# Altium footprint library nccpcblib.PcbLib: 63 footprints (part 1 of 4)
Each footprint in its own frame and in the unit in brackets; x right, y up, seen from the top. Pads: shape width x height; smd on the part's side, far side on the other; paste and mask are expansions set on the pad; w line width, h text height; cw(c..) or ccw(c..) is an arc to the next point about the centre after c.
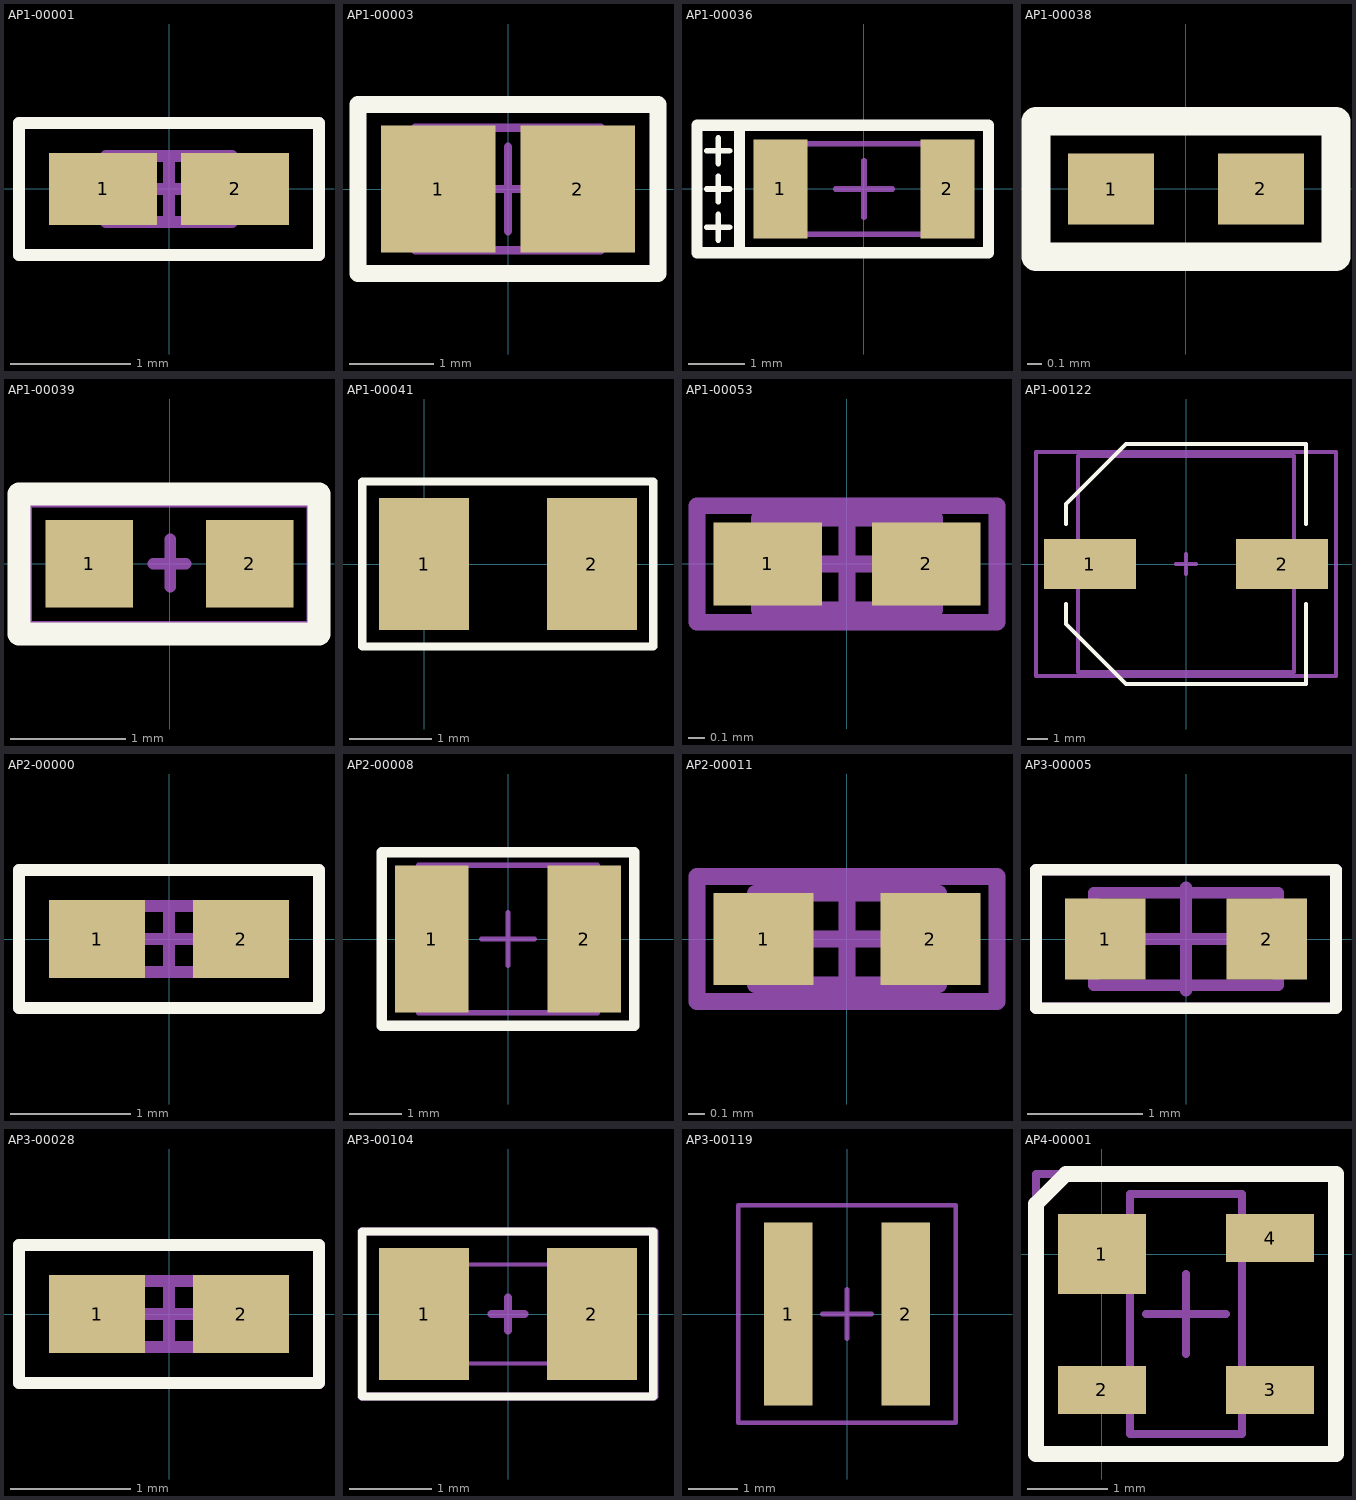
[diagram p0: the footprints below, top view; thin cyan lines are the x and y axes]

## AP1-00001 [mm] "Standard 0402 SMD capacitor footprint"
height 0.55
pads (2):
  rect 0.9x0.6 smd: 1(-0.55,0) 2(0.55,0)
Top Overlay:
  lines w0.1: -1.25,-0.55 1.25,-0.55 1.25,0.55 -1.25,0.55 -1.25,-0.55
Mechanical 13:
  lines w0.1: -0.525,-0.275 0.525,-0.275 0.525,0.275 -0.525,0.275 -0.525,-0.275
Mechanical 15:
  lines w0.1: -0.275,0 0.275,0 ; 0,-0.275 0,0.275 ; -1.25,-0.55 1.25,-0.55 1.25,0.55 -1.25,0.55 -1.25,-0.55
3D body: height 0.2, standoff 0, extent -0.5,-0.3 0.5,0.3

## AP1-00003 [mm]
height 1.3
pads (2):
  rect 1.35x1.5 smd: 1(-0.825,0) 2(0.825,0)
Top Overlay:
  lines w0.2: -1.775,-1 -1.775,1 1.775,1 1.775,-1 -1.775,-1
Mechanical 13:
  lines w0.1: -1.1,-0.725 1.1,-0.725 1.1,0.725 -1.1,0.725 -1.1,-0.725
Mechanical 15:
  lines w0.1: -0.5,0 0.5,0 ; 0,-0.5 0,0.5 ; -1.775,-1 1.775,-1 1.775,1 -1.775,1 -1.775,-1
3D body: height 0.78, standoff 0, extent -1,-0.625 1,0.625

## AP1-00036 [mm] "SMD capacitors: 3216-18 EIA Case 1206, polarized"
height 1.5
pads (2):
  rect 0.95x1.75 smd: 1(-1.475,0) 2(1.475,0)
Top Overlay:
  lines w0.1: -2.775,-0.675 -2.375,-0.675 ; -2.775,0 -2.375,0 ; -2.775,0.675 -2.375,0.675 ; -2.575,-0.9 -2.575,-0.45 ; -2.575,-0.225 -2.575,0.225 ; -2.575,0.45 -2.575,0.9
  lines w0.2: -2.2,-1.125 -2.2,1.125 ; -2.2,-1.125 -2.95,-1.125 -2.95,1.125 -2.2,1.125 ; -2.2,-1.125 2.2,-1.125 2.2,1.125 -2.2,1.125
Mechanical 13:
  lines w0.1: -1.6,-0.8 -1.6,0.8 1.6,0.8 1.6,-0.8 -1.6,-0.8
Mechanical 15:
  lines w0.1: -0.5,0 0.5,0 ; 0,-0.5 0,0.5 ; -2.2,-1.125 -2.2,1.125 2.2,1.125 2.2,-1.125 -2.2,-1.125
3D body: height 1, standoff 0, extent -1.6,-0.8 1.6,0.8

## AP1-00038 [mm] "Generic pad 0402, spacing 0.45mm"
height 0.4
pads (2):
  rect 0.6x0.5 smd: 1(-0.525,0) 2(0.525,0)
Top Overlay:
  lines w0.2: -1.05,-0.475 -1.05,0.475 1.05,0.475 1.05,-0.475 -1.05,-0.475
3D body: height 0.2, standoff 0, extent -0.5,-0.3 0.5,0.3

## AP1-00039 [mil] "Capacitor 0603 Hight 0.8mm"
height 31.5
pads (2):
  rect 30x30 smd: 1(-27.5,0) 2(27.5,0)
Top Overlay:
  lines w7.87: -51.59,-23.98 -51.59,23.9 51.16,23.9 51.16,-23.98 -51.59,-23.98
Mechanical 15:
  lines w3.94: -5.57,0.04 0.14,0.04 ; 0.14,-7.84 0.14,0.04 ; 0.14,8.46 0.14,0.04 ; 5.58,0.04 0.14,0.04 ; -49.04,-21.46 -49.04,21.34 48.92,21.34 48.92,-21.46 -49.04,-21.46
3D body: height 11.89, standoff 0, extent -31.36,-15.71 31.64,15.79

## AP1-00041 [mil]
pads (2):
  rect 43x63 smd: 1(0,0) 2(80,0)
Top Overlay:
  lines w3.94: -29.53,-39.37 -29.53,39.37 109.25,39.37 109.25,-39.37 -29.53,-39.37
3D body: height 30.79, standoff 0, extent 0.63,-24.6 79.37,24.6

## AP1-00053 [mm] "Chip Capacitor, 2-Leads, Body 1.0x0.5mm, IPC High Density"
height 0.55
pads (2):
  rect 0.65x0.5 smd: 1(-0.475,0) 2(0.475,0)
Mechanical 13:
  lines w0.1: -0.525,-0.275 0.525,-0.275 0.525,0.275 -0.525,0.275 -0.525,-0.275
Mechanical 15:
  lines w0.1: -0.275,0 0.275,0 ; 0,-0.275 0,0.275 ; -0.9,-0.35 0.9,-0.35 0.9,0.35 -0.9,0.35 -0.9,-0.35
3D body: height 0.2, standoff 0, extent -0.5,-0.3 0.5,0.3

## AP1-00122 [mm]
pads (2):
  rect 4.6x2.5 smd: 1(-4.8,0) 2(4.8,0)
Top Overlay:
  lines w0.2: -6,-2 -6,-3 -3,-6 6,-6 6,-2 ; -6,2 -6,3 -3,6 6,6 6,2
Mechanical 13:
  lines w0.2: -5.4,-5.4 -5.4,5.4 5.4,5.4 5.4,-5.4 -5.4,-5.4
Mechanical 15:
  lines w0.2: -0.5,0 0.5,0 ; 0,-0.5 0,0.5 ; -7.5,-5.6 7.5,-5.6 7.5,5.6 -7.5,5.6 -7.5,-5.6
3D body: height 6.9, standoff 1.4, extent -5.208,-5.239 5.25,5.24
3D body: height 1.5, standoff 0.1, extent -5.4,-5.4 5.4,5.4

## AP2-00000 [mm] "Standard 0402 SMD resistor footprint"
height 0.4
pads (2):
  rect 0.8x0.65 smd: 1(-0.6,0) 2(0.6,0)
Top Overlay:
  lines w0.1: -1.25,-0.575 -1.25,0.575 1.25,0.575 1.25,-0.575 -1.25,-0.575
Mechanical 13:
  lines w0.1: -0.55,-0.275 0.55,-0.275 0.55,0.275 -0.55,0.275 -0.55,-0.275
Mechanical 15:
  lines w0.1: -0.275,0 0.275,0 ; 0,-0.275 0,0.275 ; -1.25,-0.575 1.25,-0.575 1.25,0.575 -1.25,0.575 -1.25,-0.575
3D body: height 0.2, standoff 0, extent -0.5,-0.3 0.5,0.3

## AP2-00008 [mm]
height 0.7
pads (2):
  rect 1.4x2.8 smd: 1(-1.45,0) 2(1.45,0)
Top Overlay:
  lines w0.2: -2.4,-1.65 2.4,-1.65 2.4,1.65 -2.4,1.65 -2.4,-1.65
Mechanical 13:
  lines w0.1: -1.7,-1.4 -1.7,1.4 1.7,1.4 1.7,-1.4 -1.7,-1.4
Mechanical 15:
  lines w0.1: -0.5,0 0.5,0 ; 0,-0.5 0,0.5 ; -2.4,-1.65 -2.4,1.65 2.4,1.65 2.4,-1.65 -2.4,-1.65
3D body: height 0.55, standoff 0, extent -1.6,-1.25 1.6,1.25

## AP2-00011 [mm] "Chip Resistor, 2-Leads, Body 1,0x0,5mm, IPC High Density"
height 0.4
pads (2):
  rect 0.6x0.55 smd: 1(-0.5,0) 2(0.5,0)
Mechanical 13:
  lines w0.1: -0.55,-0.275 0.55,-0.275 0.55,0.275 -0.55,0.275 -0.55,-0.275
Mechanical 15:
  lines w0.1: -0.275,0 0.275,0 ; 0,-0.275 0,0.275 ; -0.9,-0.375 0.9,-0.375 0.9,0.375 -0.9,0.375 -0.9,-0.375
3D body: height 0.2, standoff 0, extent -0.5,-0.3 0.5,0.3

## AP3-00005 [mm]
height 0.6
pads (2):
  rect 0.7x0.7 smd: 1(-0.7,0) 2(0.7,0)
Top Overlay:
  lines w0.1: -1.3,-0.6 1.3,-0.6 1.3,0.6 -1.3,0.6 -1.3,-0.6
Mechanical 13:
  lines w0.1: -0.8,-0.4 -0.8,0.4 0.8,0.4 0.8,-0.4 -0.8,-0.4
Mechanical 15:
  lines w0.1: -0.45,0 0.45,0 ; 0,-0.45 0,0.45 ; -1.3,-0.6 -1.3,0.6 1.3,0.6 1.3,-0.6 -1.3,-0.6
3D body: height 0.75, standoff 0.74, extent -0.8,-0.4 0.8,0.4
3D body: height 0.74, standoff 0.05, extent -0.8,-0.4 0.8,0.4
3D body: height 0.8, standoff 0, extent -0.825,-0.412 -0.4,0.413
3D body: height 0.8, standoff 0, extent 0.4,-0.413 0.825,0.412

## AP3-00028 [mm] "0402 SMD EMI inductor footprint, Murata"
height 0.55
pads (2):
  rect 0.8x0.65 smd: 1(-0.6,0) 2(0.6,0)
Top Overlay:
  lines w0.1: -1.25,-0.575 -1.25,0.575 1.25,0.575 1.25,-0.575 -1.25,-0.575
Mechanical 13:
  lines w0.1: -0.55,-0.275 0.55,-0.275 0.55,0.275 -0.55,0.275 -0.55,-0.275
Mechanical 15:
  lines w0.1: -0.275,0 0.275,0 ; 0,-0.275 0,0.275 ; -1.25,-0.575 1.25,-0.575 1.25,0.575 -1.25,0.575 -1.25,-0.575
3D body: height 0.41, standoff 0, extent 0.45,-0.3 0.575,0.3
3D body: height 0.41, standoff 0, extent -0.575,-0.3 -0.45,0.3
3D body: height 0.4, standoff 0.01, extent -0.55,-0.275 0.55,0.275

## AP3-00104 [mil] "0805 with EMIFIL chip 3D model, hight 0.85mm"
height 33.46
pads (2):
  rect 43x63 smd: 1(-40,0) 2(40,0)
Top Overlay:
  lines w3.94: -69.53,-39.37 69.25,-39.37 69.25,39.37 -69.53,39.37 -69.53,-39.37
Mechanical 13:
  lines w1.97: -39.37,-23.62 -39.37,23.62 39.37,23.62 39.37,-23.62 -39.37,-23.62
Mechanical 15:
  lines w3.94: -7.87,0 7.87,0 ; 0,-7.87 0,7.87 ; -69.88,-39.37 -69.88,39.37 69.88,39.37 69.88,-39.37 -69.88,-39.37
3D body: height 37.4, standoff 0, extent -39.37,-23.62 39.37,23.62

## AP3-00119 [mm]
height 2
pads (2):
  rect 0.98x3.7 smd paste-0.125: 1(-1.185,0) 2(1.185,0)
Mechanical 13:
  lines w0.1: -2.2,-2.2 -2.2,2.2 2.2,2.2 2.2,-2.2 -2.2,-2.2
Mechanical 15:
  lines w0.1: -0.5,0 0.5,0 ; 0,-0.5 0,0.5 ; -2.2,-2.2 -2.2,2.2 2.2,2.2 2.2,-2.2 -2.2,-2.2
3D body: height 2.1, standoff 0, extent -2.15,-2.15 2.15,2.15

## AP4-00001 [mm]
height 1.2
pads (4):
  rect 1.1x1 smd: 1(0,0)
  rect 1.1x0.6 smd: 2(0,-1.7) 3(2.1,-1.7) 4(2.1,0.2)
Top Overlay:
  lines w0.2: -0.825,-2.5 -0.825,0.625 -0.45,1 2.925,1 2.925,-2.5 -0.825,-2.5
Mechanical 13:
  lines w0.1: 0.35,-2.25 1.75,-2.25 1.75,0.75 0.35,0.75 0.35,-2.25
Mechanical 15:
  lines w0.1: 0.55,-0.75 1.55,-0.75 ; 1.05,-1.25 1.05,-0.25 ; -0.825,-2.5 2.925,-2.5 2.925,1 -0.825,1 -0.825,-2.5
3D body: height 1.21, standoff -0.01, extent -0.131,-2.2 2.232,0.7